# Altium schematic symbol library 13-Logic 数字 IC.SchLib: 324 symbols (part 11 of 30) (continued)
## PCI9056BA_ModeM
designator IC?
32-Bit 66MHz PCI Bus Mastering I/O Accelerator For PowerQUICC And Generic 32-Bit, 66MHz Local Bus Design
part A pins: A4 TDO (hiz), A5 TMS (in), A8 EECS (out), A9 ~{BIGEND}/~{WAIT} (io), A10 ~{DREQ0} (in), A11 USERi/~{LLOCKi} (in), A12 ~{MDREQ}/DMPAF/~{EOT} (io), A13 ~{BB} (io), A14 ~{BURST} (io), A15 MODE1 (in), A16 ~{BR} (out), B5 TCK (in), B7 ~{IDDQEN} (in), B8 EESK (out), B9 ~{CCS} (in), B10 ~{DACK1} (out), B11 ~{LINTo} (oc), B12 ~{HOSTEN} (in), B13 ~{RETRY} (hiz), B14 ~{BG} (in), B15 MODE0 (in), B16 DP2 (io), C6 ~{TRST} (in), C8 EEDI/EEDO (io), C9 ~{DACK0} (out), C10 ~{DREQ1} (in), C11 ~{LINTi} (in), C12 ~{BDIP} (io), C13 ~{TEA} (io), C14 DP1 (io), C15 ~{TA} (io), C16 LD31 (io), D6 TDI (in), D10 USERo/~{LLOCKo} (out), D11 ~{LRESET} (io), D12 ~{TS} (io), D13 DP0 (io), D14 DP3 (io), D15 LD29 (io), D16 LCLK (in), E13 ~{BI} (in), E14 LD30 (io), E15 LD28 (io), E16 LD25 (io), F14 LD27 (io), F15 LD26 (io), F16 LD24 (io), G14 LD23 (io), G15 LD22 (io), G16 LD21 (io), H13 LD20 (io), H14 LD19 (io), H15 LD18 (io), H16 LD17 (io), J14 LD14 (io), J15 LD15 (io), J16 LD16 (io), K14 LD11 (io), K15 LD12 (io), K16 LD13 (io), L13 LD4 (io), L14 LD7 (io), L15 LD8 (io), L16 LD10 (io), M13 LD1 (io), M14 LD3 (io), M15 LD6 (io), M16 LD9 (io), N8 LA3 (io), N10 LA14 (io), N11 LA20 (io), N12 LA24 (io), N13 LA29 (io), N14 LA31 (io), N15 LD2 (io), N16 LD5 (io), P7 LA0 (io), P8 LA4 (io), P9 LA9 (io), P10 LA12 (io), P11 LA15 (io), P12 LA21 (io), P13 LA25 (io), P14 RD/~{WR} (io), P15 TSIZ1 (io), P16 LD0 (io), R7 LA1 (io), R8 LA5 (io), R9 LA8 (io), R10 LA11 (io), R11 LA16 (io), R12 LA18 (io), R13 LA23 (io), R14 LA27 (io), R15 LA28 (io), R16 LA30 (io), T7 LA2 (io), T8 LA6 (io), T9 LA7 (io), T10 LA10 (io), T11 LA13 (io), T12 LA17 (io), T13 LA19 (io), T14 LA22 (io), T15 LA26 (io), T16 TSIZ0 (io)
part B pins: A1 AD25 (io), A2 AD30 (io), A3 ~{GNT0}/~{REQ} (out), A6 ~{PME} (oc), B1 AD26 (io), B2 AD27 (io), B4 ~{INTA} (io), B6 ~{BD_SEL} (in), C1 AD23 (io), C2 AD24 (io), C3 AD28 (io), C4 AD31 (io), C5 ~{RST} (io), C7 ~{PMEREQ} (in), D1 AD20 (io), D2 AD22 (io), D3 IDSEL (in), D4 AD29 (io), D5 ~{REQ0}/~{GNT} (in), E1 AD18 (io), E3 AD21 (io), E4 C/~{BE3} (io), F1 AD16 (io), F2 AD17 (io), F3 AD19 (io), G1 ~{IRDY} (io), G2 ~{FRAME} (io), G3 C/~{BE2} (io), H1 ~{LOCK} (io), H2 ~{STOP} (io), H3 ~{DEVSEL} (io), H4 ~{TRDY} (io), J1 PCLK (in), J2 ~{PERR} (io), J3 ~{SERR} (io), K1 PAR (io), K2 C/~{BE1} (io), K3 AD15 (io), L1 AD14 (io), L2 AD13 (io), L3 AD12 (io), L4 AD9 (io), M1 AD11 (io), M3 AD8 (io), M4 AD5 (io), N1 AD10 (io), N2 C/~{BE0} (io), N3 AD6 (io), N5 ~{GNT3} (out), N6 ~{REQ5} (in), N7 ~{LEDon} (oc), P1 AD7 (io), P2 AD4 (io), P3 AD0 (io), P4 ~{REQ1} (in), P5 ~{REQ3} (in), P6 ~{ENUM} (oc), R1 AD2 (io), R2 AD1 (io), R3 ~{REQ2} (in), R4 ~{GNT4} (out), R5 ~{GNT5} (out), R6 ~{REQ6} (in), T1 AD3 (io), T2 ~{GNT1} (out), T3 ~{GNT2} (out), T4 ~{REQ4} (in), T5 ~{GNT6} (out), T6 CPCISW (in)
part C pins: A7 Card_VAUX (in), B3 VIO (power), D7 2.5VAUX (in), D8 PRESENT_DET (in), D9 VCORE (power), E2 VIO (power), E5 VSS (power), E6 VSS (power), E7 VRING (power), E8 VRING (power), E9 VSS (power), E10 VRING (power), E11 VSS (power), E12 VSS (power), F4 VCORE (power), F5 VSS (power), F6 VSS (power), F7 VSS (power), F8 VSS (power), F9 VSS (power), F10 VSS (power), F11 VSS (power), F12 VSS (power), F13 VCORE (power), G4 VSS (power), G5 VRING (power), G6 VSS (power), G7 VSS (power), G8 VSS (power), G9 VSS (power), G10 VSS (power), G11 VSS (power), G12 VRING (power), G13 VSS (power), H5 VRING (power), H6 VSS (power), H7 VSS (power), H8 VSS (power), H9 VSS (power), H10 VSS (power), H11 VSS (power), H12 VRING (power), J4 VSS (power), J5 VSS (power), J6 VSS (power), J7 VSS (power), J8 VSS (power), J9 VSS (power), J10 VSS (power), J11 VSS (power), J12 VRING (power), J13 VSS (power), K4 VCORE (power), K5 VRING (power), K6 VSS (power), K7 VSS (power), K8 VSS (power), K9 VSS (power), K10 VSS (power), K11 VSS (power), K12 VRING (power), K13 VCORE (power), L5 VSS (power), L6 VSS (power), L7 VSS (power), L8 VSS (power), L9 VSS (power), L10 VSS (power), L11 VSS (power), L12 VSS (power), M2 VIO (power), M5 VSS (power), M6 VSS (power), M7 VRING (power), M8 VRING (power), M9 VSS (power), M10 VRING (power), M11 VSS (power), M12 VSS (power), N4 VIO (power), N9 VCORE (power)
part A text: M MODE
part B text: M MODE
part C text: M MODE

## PIC16F628A-I/ML
designator IC?
Flash-Based, 8-Bit CMOS Microcontrollers with nanoWatt Technology
pins: 1 RA5/~{MCLR}/VPP (in), 2 NC, 3 VSS (power), 4 NC, 5 VSS (power), 6 NC, 7 RB0/INT (io), 8 RB1/RX/DT (io), 9 RB2/TX/CK (io), 10 RB3/CCP1 (io), 11 NC, 12 RB4/PGM (io), 13 RB5 (io), 14 NC, 15 RB6/T1OSO/T1CKI/PGC (io), 16 RB7/T1OSI/PGD (io), 17 VDD (power), 18 NC, 19 VDD (power), 20 RA6/OSC2/CLKOUT (io), 21 RA7/OSC1/CLKIN (io), 22 NC, 23 RA0/AN0 (io), 24 RA1/AN1 (io), 25 NC, 26 RA2/AN2/VREF (io), 27 RA3/AN3/CMP1 (io), 28 RA4/T0CKI/CMP2 (io), 29 EP (power)

## PIC16F628A-I/P
designator IC?
Flash-Based, 8-Bit CMOS Microcontrollers with nanoWatt Technology
pins: 1 RA2/AN2/VREF (io), 2 RA3/AN3/CMP1 (io), 3 RA4/T0CKI/CMP2 (io), 4 RA5/~{MCLR}/VPP (in), 5 VSS (power), 6 RB0/INT (io), 7 RB1/RX/DT (io), 8 RB2/TX/CK (io), 9 RB3/CCP1 (io), 10 RB4/PGM (io), 11 RB5 (io), 12 RB6/T1OSO/T1CKI/PGC (io), 13 RB7/T1OSI/PGD (io), 14 VDD (power), 15 RA6/OSC2/CLKOUT (io), 16 RA7/OSC1/CLKIN (io), 17 RA0/AN0 (io), 18 RA1/AN1 (io)

## PIC16F628A-I/SO
designator IC?
Flash-Based, 8-Bit CMOS Microcontrollers with nanoWatt Technology
pins: 1 RA2/AN2/VREF (io), 2 RA3/AN3/CMP1 (io), 3 RA4/T0CKI/CMP2 (io), 4 RA5/~{MCLR}/VPP (in), 5 VSS (power), 6 RB0/INT (io), 7 RB1/RX/DT (io), 8 RB2/TX/CK (io), 9 RB3/CCP1 (io), 10 RB4/PGM (io), 11 RB5 (io), 12 RB6/T1OSO/T1CKI/PGC (io), 13 RB7/T1OSI/PGD (io), 14 VDD (power), 15 RA6/OSC2/CLKOUT (io), 16 RA7/OSC1/CLKIN (io), 17 RA0/AN0 (io), 18 RA1/AN1 (io)

## PIC16F628A-I/SS
designator IC?
Flash-Based, 8-Bit CMOS Microcontrollers with nanoWatt Technology
pins: 1 RA2/AN2/VREF (io), 2 RA3/AN3/CMP1 (io), 3 RA4/T0CKI/CMP2 (io), 4 RA5/~{MCLR}/VPP (in), 5 VSS (power), 6 VSS (power), 7 RB0/INT (io), 8 RB1/RX/DT (io), 9 RB2/TX/CK (io), 10 RB3/CCP1 (io), 11 RB4/PGM (io), 12 RB5 (io), 13 RB6/T1OSO/T1CKI/PGC (io), 14 RB7/T1OSI/PGD (io), 15 VDD (power), 16 VDD (power), 17 RA6/OSC2/CLKOUT (io), 18 RA7/OSC1/CLKIN (io), 19 RA0/AN0 (io), 20 RA1/AN1 (io)

## PIC16F690-E/P
designator IC?
20 Pins Flash-Based, 8-Bit CMOS Microcontrollers with nanoWatt Technology
pins: 1 VDD (power), 2 RA5/T1CKI/OSC1/CLKIN (io), 3 RA4/AN3/~{T1G}/OSC2/CLKOUT (io), 4 RA3/~{MCLR}/VPP (in), 5 RC5/CCP1/P1A (io), 6 RC4/C2OUT/P1B (io), 7 RC3/AN7/C12IN3-/P1C (io), 8 RC6/AN8/~{SS} (io), 9 RC7/AN9/SDO (io), 10 RB7/TX/CK (io), 11 RB6/SCK/SCL (io), 12 RB5/AN11/RX/DT (io), 13 RB4/AN10/SDI/SDA (io), 14 RC2/AN6/C12IN2-/P1D (io), 15 RC1/AN5/C12IN1- (io), 16 RC0/AN4/C2IN+ (io), 17 RA2/AN2/T0CKI/INT/C1OUT (io), 18 RA1/AN1/C12IN0-/VREF/ICSPCLK (io), 19 RA0/AN0/C1IN+/ICSPDAT/ULPWU (io), 20 VSS (power)

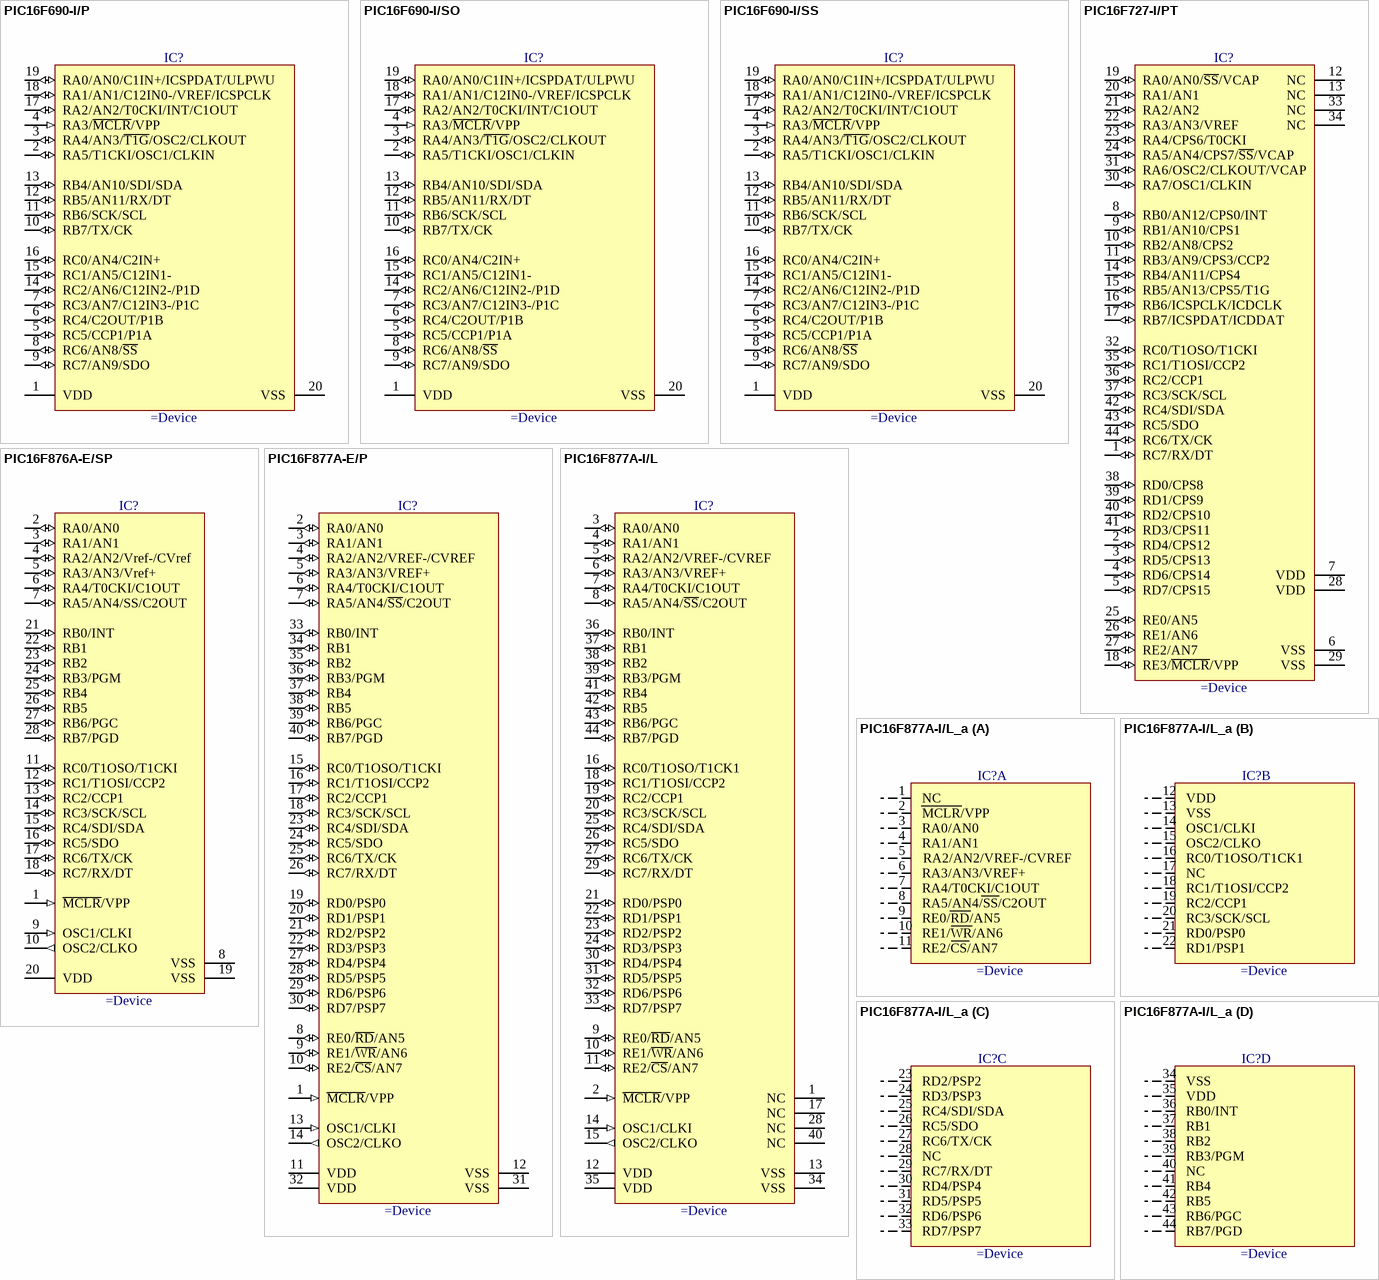
[diagram p69: symbols PIC16F690-I/P to PIC16F877A-I/L_a]

## PIC16F690-I/P
designator IC?
20 Pins Flash-Based, 8-Bit CMOS Microcontrollers with nanoWatt Technology
pins: 1 VDD (power), 2 RA5/T1CKI/OSC1/CLKIN (io), 3 RA4/AN3/~{T1G}/OSC2/CLKOUT (io), 4 RA3/~{MCLR}/VPP (in), 5 RC5/CCP1/P1A (io), 6 RC4/C2OUT/P1B (io), 7 RC3/AN7/C12IN3-/P1C (io), 8 RC6/AN8/~{SS} (io), 9 RC7/AN9/SDO (io), 10 RB7/TX/CK (io), 11 RB6/SCK/SCL (io), 12 RB5/AN11/RX/DT (io), 13 RB4/AN10/SDI/SDA (io), 14 RC2/AN6/C12IN2-/P1D (io), 15 RC1/AN5/C12IN1- (io), 16 RC0/AN4/C2IN+ (io), 17 RA2/AN2/T0CKI/INT/C1OUT (io), 18 RA1/AN1/C12IN0-/VREF/ICSPCLK (io), 19 RA0/AN0/C1IN+/ICSPDAT/ULPWU (io), 20 VSS (power)

## PIC16F690-I/SO
designator IC?
20 Pins Flash-Based, 8-Bit CMOS Microcontrollers with nanoWatt Technology
pins: 1 VDD (power), 2 RA5/T1CKI/OSC1/CLKIN (io), 3 RA4/AN3/~{T1G}/OSC2/CLKOUT (io), 4 RA3/~{MCLR}/VPP (in), 5 RC5/CCP1/P1A (io), 6 RC4/C2OUT/P1B (io), 7 RC3/AN7/C12IN3-/P1C (io), 8 RC6/AN8/~{SS} (io), 9 RC7/AN9/SDO (io), 10 RB7/TX/CK (io), 11 RB6/SCK/SCL (io), 12 RB5/AN11/RX/DT (io), 13 RB4/AN10/SDI/SDA (io), 14 RC2/AN6/C12IN2-/P1D (io), 15 RC1/AN5/C12IN1- (io), 16 RC0/AN4/C2IN+ (io), 17 RA2/AN2/T0CKI/INT/C1OUT (io), 18 RA1/AN1/C12IN0-/VREF/ICSPCLK (io), 19 RA0/AN0/C1IN+/ICSPDAT/ULPWU (io), 20 VSS (power)

## PIC16F690-I/SS
designator IC?
20 Pins Flash-Based, 8-Bit CMOS Microcontrollers with nanoWatt Technology
pins: 1 VDD (power), 2 RA5/T1CKI/OSC1/CLKIN (io), 3 RA4/AN3/~{T1G}/OSC2/CLKOUT (io), 4 RA3/~{MCLR}/VPP (in), 5 RC5/CCP1/P1A (io), 6 RC4/C2OUT/P1B (io), 7 RC3/AN7/C12IN3-/P1C (io), 8 RC6/AN8/~{SS} (io), 9 RC7/AN9/SDO (io), 10 RB7/TX/CK (io), 11 RB6/SCK/SCL (io), 12 RB5/AN11/RX/DT (io), 13 RB4/AN10/SDI/SDA (io), 14 RC2/AN6/C12IN2-/P1D (io), 15 RC1/AN5/C12IN1- (io), 16 RC0/AN4/C2IN+ (io), 17 RA2/AN2/T0CKI/INT/C1OUT (io), 18 RA1/AN1/C12IN0-/VREF/ICSPCLK (io), 19 RA0/AN0/C1IN+/ICSPDAT/ULPWU (io), 20 VSS (power)

## PIC16F727-I/PT
designator IC?
Flash-Based, 8-Bit CMOS Microcontroller, 8K (x14-Bit words) Program Memory, 368 Bytes Data Memory, 36 I/O pins, 44-Pin TQFP, Standard VDD Range, Industrial Temperature
pins: 1 RC7/RX/DT (io), 2 RD4/CPS12 (io), 3 RD5/CPS13 (io), 4 RD6/CPS14 (io), 5 RD7/CPS15 (io), 6 VSS (power), 7 VDD (power), 8 RB0/AN12/CPS0/INT (io), 9 RB1/AN10/CPS1 (io), 10 RB2/AN8/CPS2 (io), 11 RB3/AN9/CPS3/CCP2 (io), 12 NC, 13 NC, 14 RB4/AN11/CPS4 (io), 15 RB5/AN13/CPS5/T1G (io), 16 RB6/ICSPCLK/ICDCLK (io), 17 RB7/ICSPDAT/ICDDAT (io), 18 RE3/~{MCLR}/VPP (io), 19 RA0/AN0/~{SS}/VCAP (io), 20 RA1/AN1 (io), 21 RA2/AN2 (io), 22 RA3/AN3/VREF (io), 23 RA4/CPS6/T0CKI (io), 24 RA5/AN4/CPS7/~{SS}/VCAP (io), 25 RE0/AN5 (io), 26 RE1/AN6 (io), 27 RE2/AN7 (io), 28 VDD (power), 29 VSS (power), 30 RA7/OSC1/CLKIN (io), 31 RA6/OSC2/CLKOUT/VCAP (io), 32 RC0/T1OSO/T1CKI (io), 33 NC, 34 NC, 35 RC1/T1OSI/CCP2 (io), 36 RC2/CCP1 (io), 37 RC3/SCK/SCL (io), 38 RD0/CPS8 (io), 39 RD1/CPS9 (io), 40 RD2/CPS10 (io), 41 RD3/CPS11 (io), 42 RC4/SDI/SDA (io), 43 RC5/SDO (io), 44 RC6/TX/CK (io)

## PIC16F876A-E/SP
designator IC?
28 Pins Enhanced Flash Microcontroller
pins: 1 ~{MCLR}/VPP (in), 2 RA0/AN0 (io), 3 RA1/AN1 (io), 4 RA2/AN2/Vref-/CVref (io), 5 RA3/AN3/Vref+ (io), 6 RA4/T0CKI/C1OUT (io), 7 RA5/AN4/SS/C2OUT (io), 8 VSS (power), 9 OSC1/CLKI (in), 10 OSC2/CLKO (out), 11 RC0/T1OSO/T1CKI (io), 12 RC1/T1OSI/CCP2 (io), 13 RC2/CCP1 (io), 14 RC3/SCK/SCL (io), 15 RC4/SDI/SDA (io), 16 RC5/SDO (io), 17 RC6/TX/CK (io), 18 RC7/RX/DT (io), 19 VSS (power), 20 VDD (power), 21 RB0/INT (io), 22 RB1 (io), 23 RB2 (io), 24 RB3/PGM (io), 25 RB4 (io), 26 RB5 (io), 27 RB6/PGC (io), 28 RB7/PGD (io)

## PIC16F877A-E/P
designator IC?
40-Pin Enhanced Flash Microcontroller
pins: 1 ~{MCLR}/VPP (in), 2 RA0/AN0 (io), 3 RA1/AN1 (io), 4 RA2/AN2/VREF-/CVREF (io), 5 RA3/AN3/VREF+ (io), 6 RA4/T0CKI/C1OUT (io), 7 RA5/AN4/~{SS}/C2OUT (io), 8 RE0/~{RD}/AN5 (io), 9 RE1/~{WR}/AN6 (io), 10 RE2/~{CS}/AN7 (io), 11 VDD (power), 12 VSS (power), 13 OSC1/CLKI (in), 14 OSC2/CLKO (out), 15 RC0/T1OSO/T1CKI (io), 16 RC1/T1OSI/CCP2 (io), 17 RC2/CCP1 (io), 18 RC3/SCK/SCL (io), 19 RD0/PSP0 (io), 20 RD1/PSP1 (io), 21 RD2/PSP2 (io), 22 RD3/PSP3 (io), 23 RC4/SDI/SDA (io), 24 RC5/SDO (io), 25 RC6/TX/CK (io), 26 RC7/RX/DT (io), 27 RD4/PSP4 (io), 28 RD5/PSP5 (io), 29 RD6/PSP6 (io), 30 RD7/PSP7 (io), 31 VSS (power), 32 VDD (power), 33 RB0/INT (io), 34 RB1 (io), 35 RB2 (io), 36 RB3/PGM (io), 37 RB4 (io), 38 RB5 (io), 39 RB6/PGC (io), 40 RB7/PGD (io)

## PIC16F877A-I/L
designator IC?
44-Pin Enhanced Flash Microcontroller
pins: 1 NC, 2 ~{MCLR}/VPP (in), 3 RA0/AN0 (io), 4 RA1/AN1 (io), 5 RA2/AN2/VREF-/CVREF (io), 6 RA3/AN3/VREF+ (io), 7 RA4/T0CKI/C1OUT (io), 8 RA5/AN4/~{SS}/C2OUT (io), 9 RE0/~{RD}/AN5 (io), 10 RE1/~{WR}/AN6 (io), 11 RE2/~{CS}/AN7 (io), 12 VDD (power), 13 VSS (power), 14 OSC1/CLKI (in), 15 OSC2/CLKO (out), 16 RC0/T1OSO/T1CK1 (io), 17 NC, 18 RC1/T1OSI/CCP2 (io), 19 RC2/CCP1 (io), 20 RC3/SCK/SCL (io), 21 RD0/PSP0 (io), 22 RD1/PSP1 (io), 23 RD2/PSP2 (io), 24 RD3/PSP3 (io), 25 RC4/SDI/SDA (io), 26 RC5/SDO (io), 27 RC6/TX/CK (io), 28 NC, 29 RC7/RX/DT (io), 30 RD4/PSP4 (io), 31 RD5/PSP5 (io), 32 RD6/PSP6 (io), 33 RD7/PSP7 (io), 34 VSS (power), 35 VDD (power), 36 RB0/INT (io), 37 RB1 (io), 38 RB2 (io), 39 RB3/PGM (io), 40 NC, 41 RB4 (io), 42 RB5 (io), 43 RB6/PGC (io), 44 RB7/PGD (io)

## PIC16F877A-I/L_a
designator IC?
44-Pin Enhanced Flash Microcontroller
part A text: 1; NC; 2; MCLR/VPP; 3; RA0/AN0; 4; RA1/AN1; 5; RA2/AN2/VREF-/CVREF; 6; RA3/AN3/VREF+; 7; RA4/T0CKI/C1OUT; 8; RA5/AN4/SS/C2OUT; 9; RE0/RD/AN5; 10; RE1/WR/AN6; 11; RE2/CS/AN7
part B text: 12; VDD; 13; VSS; 14; OSC1/CLKI; 15; OSC2/CLKO; 16; RC0/T1OSO/T1CK1; 17; NC; 18; RC1/T1OSI/CCP2; 19; RC2/CCP1; 20; RC3/SCK/SCL; 21; RD0/PSP0; 22; RD1/PSP1
part C text: 23; RD2/PSP2; 24; RD3/PSP3; 25; RC4/SDI/SDA; 26; RC5/SDO; 27; RC6/TX/CK; 28; NC; 29; RC7/RX/DT; 30; RD4/PSP4; 31; RD5/PSP5; 32; RD6/PSP6; 33; RD7/PSP7
part D text: 34; VSS; 35; VDD; 36; RB0/INT; 37; RB1; 38; RB2; 39; RB3/PGM; 40; NC; 41; RB4; 42; RB5; 43; RB6/PGC; 44; RB7/PGD

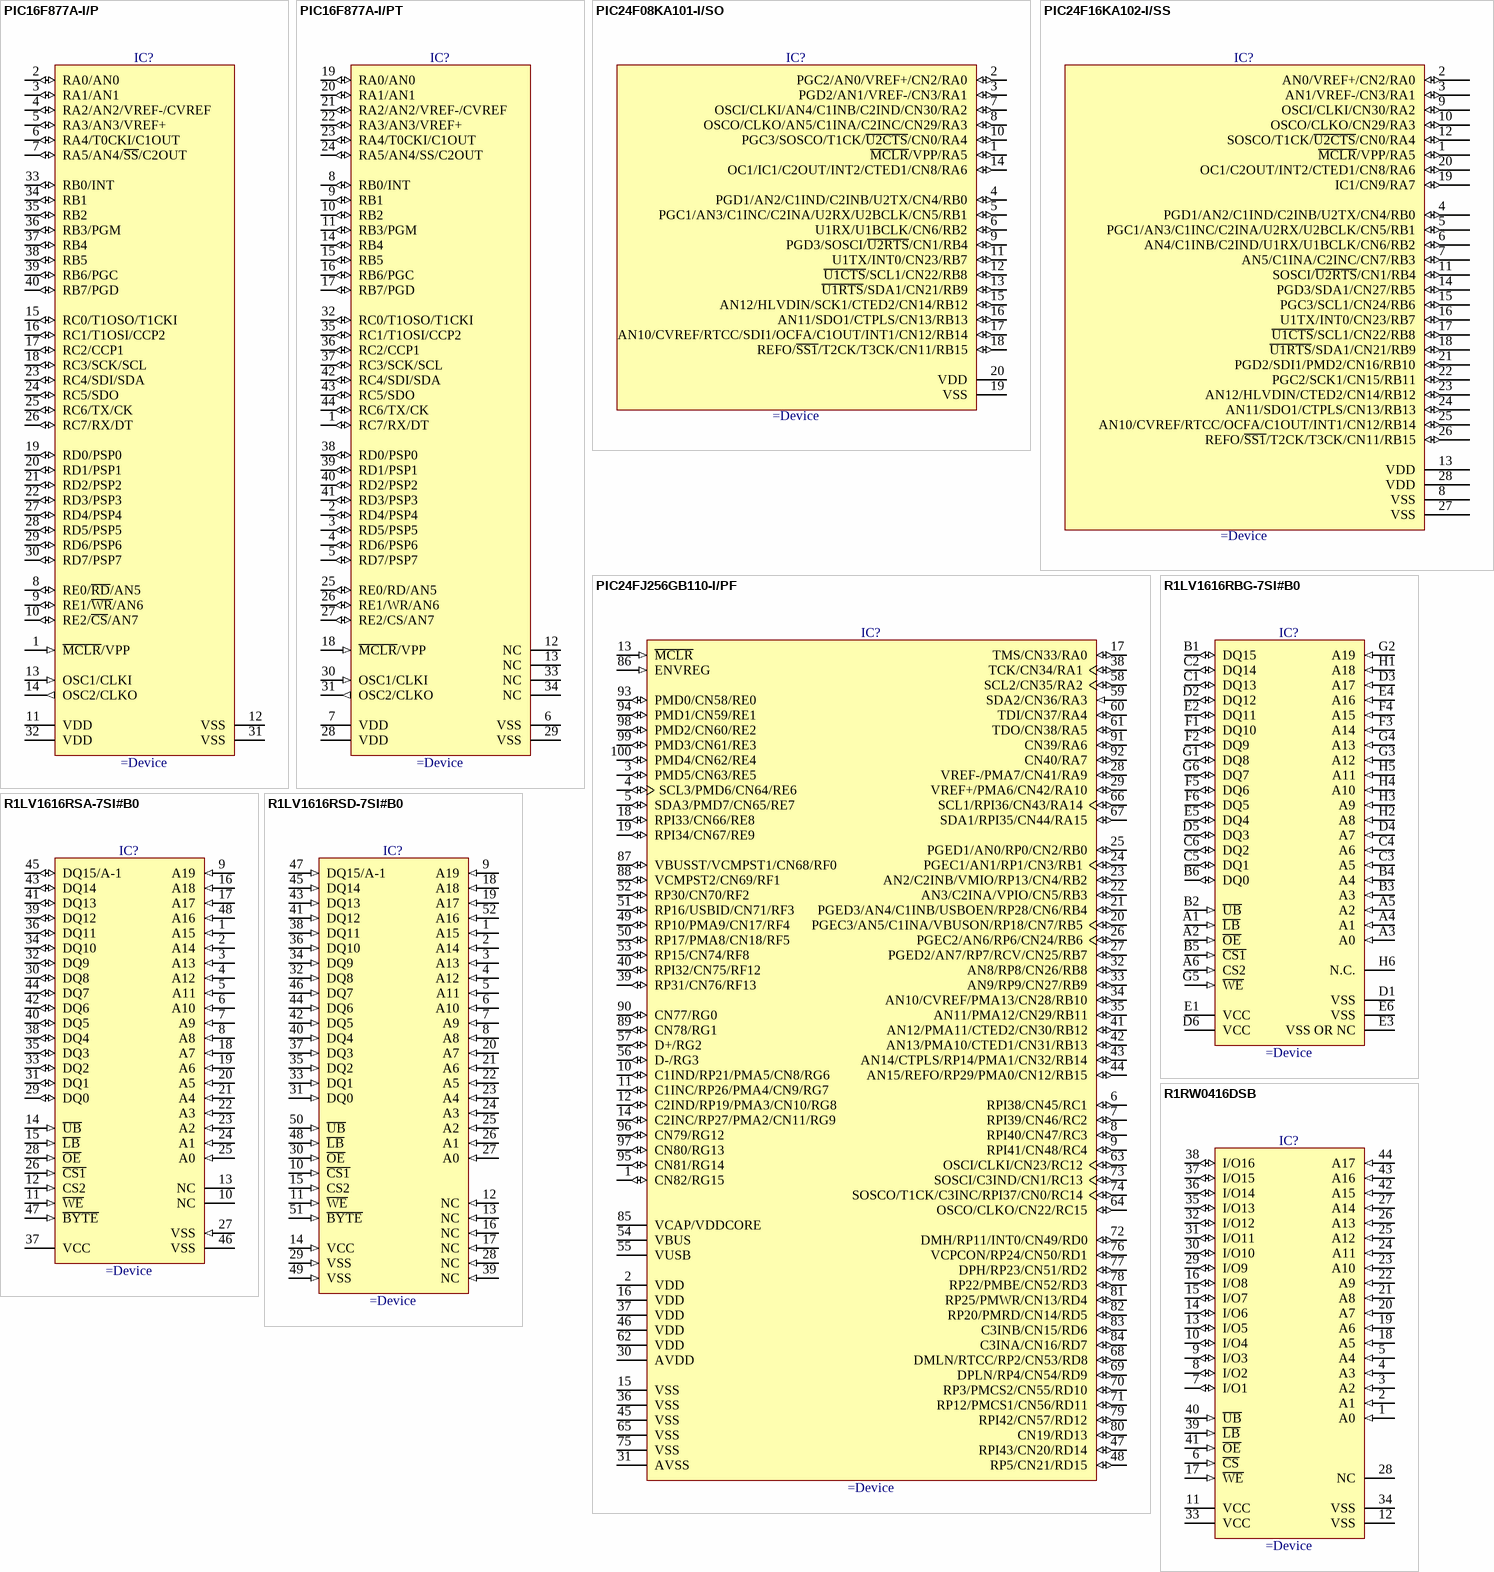
[diagram p70: symbols PIC16F877A-I/P to R1RW0416DSB]

## PIC16F877A-I/P
designator IC?
40-Pin Enhanced Flash Microcontroller
pins: 1 ~{MCLR}/VPP (in), 2 RA0/AN0 (io), 3 RA1/AN1 (io), 4 RA2/AN2/VREF-/CVREF (io), 5 RA3/AN3/VREF+ (io), 6 RA4/T0CKI/C1OUT (io), 7 RA5/AN4/~{SS}/C2OUT (io), 8 RE0/~{RD}/AN5 (io), 9 RE1/~{WR}/AN6 (io), 10 RE2/~{CS}/AN7 (io), 11 VDD (power), 12 VSS (power), 13 OSC1/CLKI (in), 14 OSC2/CLKO (out), 15 RC0/T1OSO/T1CKI (io), 16 RC1/T1OSI/CCP2 (io), 17 RC2/CCP1 (io), 18 RC3/SCK/SCL (io), 19 RD0/PSP0 (io), 20 RD1/PSP1 (io), 21 RD2/PSP2 (io), 22 RD3/PSP3 (io), 23 RC4/SDI/SDA (io), 24 RC5/SDO (io), 25 RC6/TX/CK (io), 26 RC7/RX/DT (io), 27 RD4/PSP4 (io), 28 RD5/PSP5 (io), 29 RD6/PSP6 (io), 30 RD7/PSP7 (io), 31 VSS (power), 32 VDD (power), 33 RB0/INT (io), 34 RB1 (io), 35 RB2 (io), 36 RB3/PGM (io), 37 RB4 (io), 38 RB5 (io), 39 RB6/PGC (io), 40 RB7/PGD (io)